# Altium integrated library CbyP.IntLib: 1144 symbols (part 6 of 6)
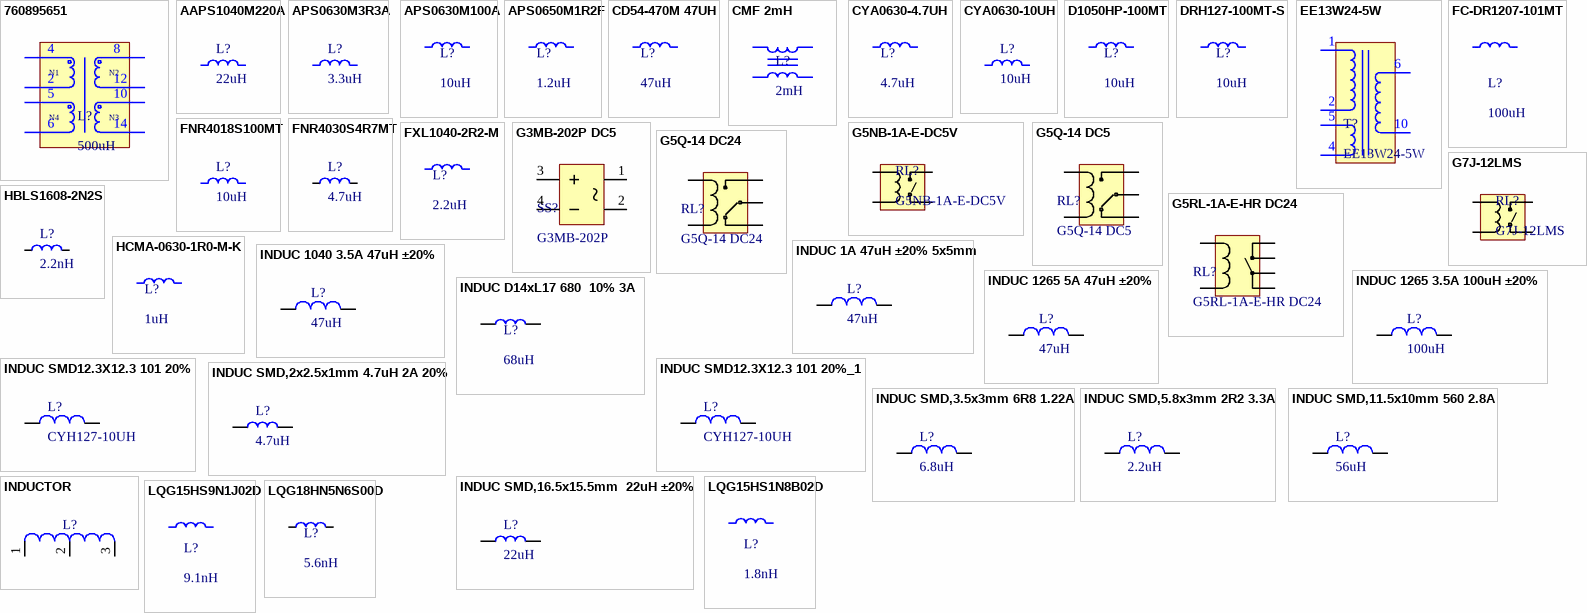
[diagram p46: symbols 760895651 to LQG18HN5N6S00D]

## INDUC SMD,11.5x10mm 560 2.8A
designator L?, comment 56uH
2.8A 56uH Integrated molded inductor ±20% 3.2A SMD,11.5x10mm Power Inductors ROHS; Manufacturer: cjiang (Changjiang Microelectronics Tech); Mfr.Part #: FXL1040-560-M; Name: INDUC SMD,11.5x10mm 560 2.8A; So_Chan_Dan: 2; So_Chan_Cam: 0; Package: SMD,11.5x10mm
footprint SMD,11.5x10mm-(1040)
footprint SMD,10.2x11mm-(1040)
pins: 1, 2

## INDUC SMD,16.5x15.5mm  22uH ±20%
designator L?, comment 22uH
22 µH Shielded Inductor 16 A 15.8mOhm Max Nonstandard; Manufacturer: Bourns Inc.; Mfr.Part #: SRP1510CA-220M; So_Chan_Dan: 2; So_Chan_Cam: 0; Name: INDUC SMD,16.5x15.5mm  22uH ±20%; Package: SMD,16.5x15.5mm
footprint SMD16.5x15.5mm
pins: 1, 2

## INDUCTOR
designator L?
footprint 8X10
pins: 1, 2, 3

## LQG15HS1N8B02D
designator L?, comment 1.8nH
FIXED IND 1.8nH 950mA 80mΩ 0402; Manufacturer: muRata; Mfr.Part #: LQG15HS1N8B02D; Package: 0402; LCSC Part #: C521065
footprint INDUC-0402-1
pins: 1, 2

## LQG15HS9N1J02D
designator L?, comment 9.1nH
FIXED IND 9.1nH 500mA 260mΩ 0402; Manufacturer: muRata; Mfr.Part #: LQG15HS9N1J02D; Package: 0402; LCSC Part #: C162547
footprint INDUC-0402
pins: 1, 2

## LQG18HN5N6S00D
designator L?, comment 5.6nH
800mA 5.6nH 200mΩ 0603 Inductors (SMD) ROHS; Manufacturer: Murata Electronics; Mfr.Part #: LQG18HN5N6S00D; Package: C441735; LCSC Part #: C41410710
footprint INDUC-0603
pins: 1, 2

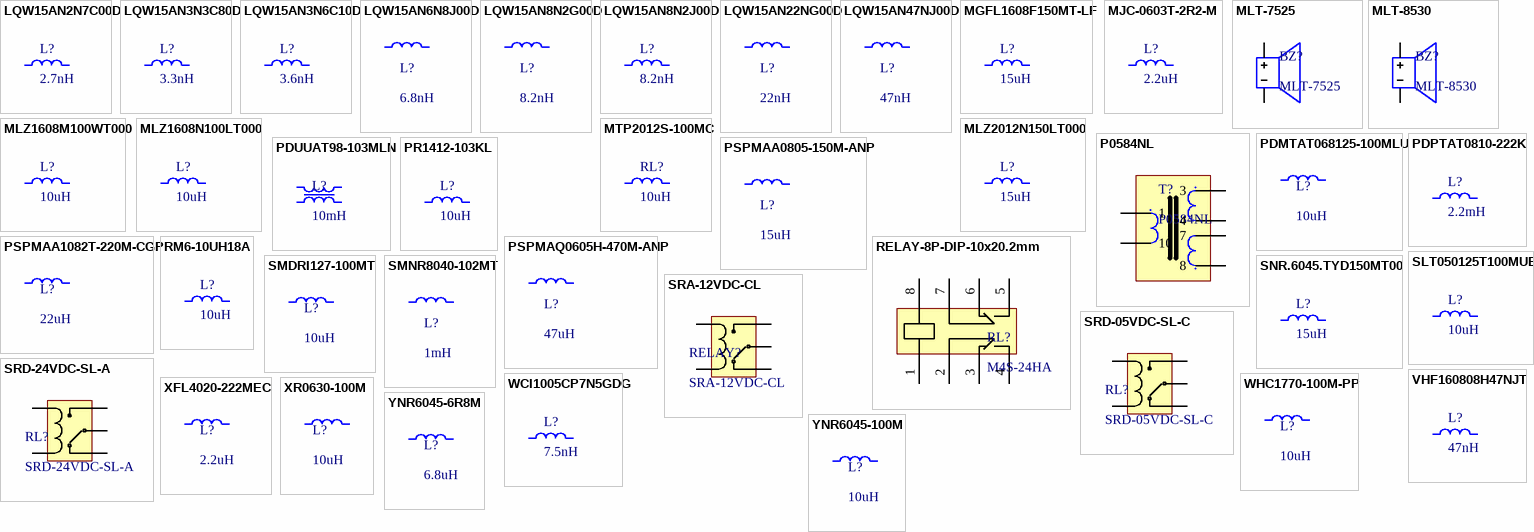
[diagram p36: symbols LQW15AN2N7C00D to YNR6045-100M]

## LQW15AN2N7C00D
designator L?, comment 2.7nH
FIXED IND 2.7nH 850mA 50mΩ 0402; Manufacturer: muRata; Mfr.Part #: LQW15AN2N7C00D; Package: 0402; LCSC Part #: C98058
footprint INDUC-0402
pins: 1, 2

## LQW15AN3N3C80D
designator L?, comment 3.3nH
FIXED IND 3.3nH 2A 30mΩ 0402; Manufacturer: muRata; Mfr.Part #: LQW15AN3N3C80D; Package: 0402; LCSC Part #: C237574
footprint INDUC-0402
pins: 1, 2

## LQW15AN3N6C10D
designator L?, comment 3.6nH
FIXED IND 3.6nH 900mA 40mΩ 0402; Manufacturer: muRata; Mfr.Part #: LQW15AN3N6C10D; Package: 0402; LCSC Part #: C408158
footprint INDUC-0402
pins: 1, 2

## LQW15AN6N8J00D
designator L?, comment 6.8nH
FIXED IND 6.8nH 700mA 90mΩ 0402; Manufacturer: muRata; Mfr.Part #: LQW15AN6N8J00D; Package: 0402; LCSC Part #: C113119
footprint INDUC-0402
pins: 1, 2

## LQW15AN8N2G00D
designator L?, comment 8.2nH
FIXED IND 8.2nH 540mA 140mΩ 0402; Manufacturer: muRata; Mfr.Part #: LQW15AN8N2G00D; Package: 0402; LCSC Part #: C84404
footprint INDUC-0402
pins: 1, 2

## LQW15AN8N2J00D
designator L?, comment 8.2nH
FIXED IND 8.2nH 540mA 140mΩ 0402; Manufacturer: muRata; Mfr.Part #: LQW15AN8N2J00D; Package: 0402; LCSC Part #: C98066
footprint INDUC-0402
pins: 1, 2

## LQW15AN22NG00D
designator L?, comment 22nH
FIXED IND 22nH 310mA 300mΩ 0402; Manufacturer: muRata; Mfr.Part #: LQW15AN22NG00D; Package: 0402; LCSC Part #: C86129
footprint INDUC-0402
pins: 1, 2

## LQW15AN47NJ00D
designator L?, comment 47nH
FIXED IND 47nH 210mA 1.08Ω 0402; Manufacturer: muRata; Mfr.Part #: LQW15AN47NJ00D; Package: 0402; LCSC Part #: C192855
footprint INDUC-0402
pins: 1, 2

## MGFL1608F150MT-LF
designator L?, comment 15uH
FIXED IND 15uH 220mA 900mΩ 0603; Manufacturer: microgate; Mfr.Part #: MGFL1608F150MT-LF; LCSC Part #: C486329; Package: 0603
footprint CAP-0603
pins: 1, 2

## MJC-0603T-2R2-M
designator L?, comment 2.2uH
9.5A 2.2uH ±20% 10A 15mΩ SMD,7.1x6.6mm Fixed Inductors RoHS; Manufacturer: Me-TECH; Mfr.Part #: MJC-0603T-2R2-M; Package: SMD,7.1x6.6mm; LCSC Part #: C501707; DigiKey Part Number: NO
footprint 0650 (SMD,7.1x6.6mm)
pins: 1, 2

## MLT-7525
designator BZ?
80dB Passive (external drive) Electromagnetic Type 2.7kHz SMD,7.5x7.5mm Buzzers ROHS; Manufacturer: Jiangsu Huaneng Elec; Mfr.Part #: MLT-7525; Name: MLT-7525; Package: SMD,7.5x7.5mm
footprint SMD,7.5x7.5mm
pins: 1 +, 2 -

## MLT-8530
designator BZ?
80dB Passive (external drive) Electromagnetic Type 2.7kHz SMD,8.5x8.5mm Buzzers ROHS; Manufacturer: Jiangsu Huaneng Elec; Mfr.Part #: MLT-8530; Name: MLT-8530; Package: SMD,8.5x8.5mm
footprint SMD,8.5x8.5mm
pins: 1 +, 2 -

## MLZ1608M100WT000
designator L?, comment 10uH
250mA 10uH 90mA 1.05Ω Multilayer inductor ±20% 0603 Fixed Inductors RoHS; Manufacturer: TDK; Mfr.Part #: MLZ1608M100WT000; LCSC Part #: C76798; Package: 0603; DigiKey Part Number: 445-6389-2-ND; ComponentLink1Description: Link; ComponentLink1URL: https://www.lcsc.com/product-detail/C76798.html; ComponentLink2Description: Link 1; ComponentLink2URL: https://www.digikey.com/en/products/detail/tdk/MLZ1608M100WT000/2465148?s=N4IgTCBcDaILIBkBaBGAbABgBxxRjA6gCr4YgC6AvkA
footprint CAP-0603
pins: 1, 2

## MLZ1608N100LT000
designator L?, comment 10uH
FIXED IND 10uH 600mΩ 0603; Manufacturer: TDK; Mfr.Part #: MLZ1608N100LT000; LCSC Part #: C194437; Package: 0603
footprint CAP-0603
pins: 1, 2

## MLZ2012N150LT000
designator L?, comment 15uH
FIXED IND 15uH 350mA 470mΩ 0805; Manufacturer: TDK; Mfr.Part #: MLZ2012N150LT000; Package: 0805; LCSC Part #: C531290
footprint INDUC-0805
pins: 1, 2

## MTP2012S-100MC
designator RL?, comment 10uH
10uH SMD,21.5x22.5mm, 6.5mΩ; Manufacturer: NO; Mfr.Part #: MTP2012S-100MC; DigiKey Part Number: NO; LCSC Part #: NO; Package: SMD,21.5x22.5mm; ComponentLink1Description: Link; ComponentLink1URL: https://detail.tmall.com/item.htm?abbucket=13&id=830337168403&mi_id=0000HfZtw201IDY-IbBo5SBGln4Rs-xlnrA7bLsp8-ByO4c&ns=1&priceTId=2100cff517743435818743772e0cc2&skuId=5563931960637&spm=a21n57.1.hoverItem.11&utparam=%7B%22aplus_abtest%22%3A%2250db852e2facc06d265983063d788b35%22%7D&xxc=taobaoSearch; ComponentLink2Description: Link 1
footprint Plugin,15.6x19.2mm
pins: 1, 2

## P0584NL
designator T?
1:1:1 Plugin,20.6x12.2mm Pulse Transformers(LAN) ROHS; Manufacturer: Pulse Elec; So_Chan_Dan: 6; So_Chan_Cam: 0; Mfr.Part #: P0584NL; Name: P0584NL; Package: Plugin,20.6x12.2mm
footprint Plugin,20.6x12.2mm
pins: 1, 3, 4, 7, 8, 10

## PDMTAT068125-100MLU
designator L?, comment 10uH
FIXED IND 10uH 18A 5mΩ Through Hole,23x12mm; Manufacturer: PROD Tech; Mfr.Part #: PDMTAT068125-100MLU; Package: Through Hole,23x12mm; LCSC Part #: C3011538; DigiKey Part Number: NO; ComponentLink1Description: Link; ComponentLink1URL: https://www.lcsc.com/product-detail/C3011538.html?s_z=n_q_c3011538; ComponentLink2Description: Link 1
footprint Through Hole,23x12mm
pins: 1, 2

## PDPTAT0810-222K
designator L?, comment 2.2mH
FIXED IND 2.2mH 150mA 3Ω Through Hole,D9.5xL12mm; Manufacturer: PROD Tech; Mfr.Part #: PDPTAT0810-222K; Package: Through Hole,D9.5xL12mm; LCSC Part #: C2924240
footprint Through Hole,D9.5xL12mm
pins: 1, 2

## PDUUAT98-103MLN
designator L?, comment 10mH
10mH@1kHz 700mΩ 2 Through Hole-4P,17x12mm Common Mode Chokes RoHS; Manufacturer: PROD Tech; Mfr.Part #: PDUUAT98-103MLN; Package: Through Hole-4P,17x12mm; LCSC Part #: C2909797; DigiKey Part Number: NO; ComponentLink1Description: Link; ComponentLink1URL: https://www.lcsc.com/product-detail/C2909797.html?s_z=n_PDUUAT98-103MLN; ComponentLink2Description: Link 1
footprint Through Hole-4P,17x12mm
pins: 1, 2, 3, 4

## PR1412-103KL
designator L?, comment 10uH
10uH SMD, 14.8.5x14.8mm, 4.5mΩ, Isat 13.2A; Manufacturer: NO; Mfr.Part #: PR1412-103KL; DigiKey Part Number: NO; LCSC Part #: NO; Package: Through Hole,19x13mm; ComponentLink1Description: Link; ComponentLink1URL: https://item.taobao.com/item.htm?abbucket=13&id=725913032063&mi_id=0000W4tRZelso7aPibs8_fbthC11EoOECsZTn6bmB6H3vFQ&ns=1&priceTId=2100c91417744267005415896e0cec&skuId=5042227721595&spm=a21n57.1.hoverItem.4&utparam=%7B%22aplus_abtest%22%3A%223d869fd202b0042b0842ae423ef7ce38%22%7D&xxc=taobaoSearch; ComponentLink2Description: Link 1
footprint PR1412
pins: 1, 2

## PSPMAA0805-150M-ANP
designator L?, comment 15uH
FIXED IND 15uH 5A 50mΩ SMD,8x8.5mm; Manufacturer: PROD Tech; Mfr.Part #: PSPMAA0805-150M-ANP; Package: SMD,8.5x8mm; LCSC Part #: C2962886
footprint SMD,8.5x8mm-0850
pins: 1, 2

## PSPMAA1082T-220M-CGP
designator L?, comment 22uH
8A 22uH 35mΩ 10A Molded Inductor ±20% SMD,11x10mm Fixed Inductors RoHS; Manufacturer: PROD Tech; Mfr.Part #: PSPMAA1082T-220M-CGP; Package: SMD,11x10mm; LCSC Part #: C47149121; DigiKey Part Number: NO; ComponentLink1Description: Link; ComponentLink1URL: https://www.lcsc.com/product-detail/C47149121.html?s_z=n_C47149121; ComponentLink2Description: Link 1
footprint SMD,11x10mm
pins: 1, 2

## PSPMAQ0605H-470M-ANP
designator L?, comment 47uH
FIXED IND 47uH 2A 180mΩ SMD,6.6x7.1mm; Manufacturer: PROD Tech; Mfr.Part #: PSPMAQ0605H-470M-ANP; Package: SMD,7.1x6.6mm; LCSC Part #: C436585
footprint 0650 (SMD,7.1x6.6mm)
pins: 1, 2

## RELAY-8P-DIP-10x20.2mm
designator RL?, comment M4S-24HA
2A 24V 30V@DC DPDT (2 Form C) 2A@125VAC DIP,10x20.2mm Signal Relays ROHS
footprint DIP,10x20.2mm
pins: 1, 2 1, 3, 4, 5, 6, 7, 8

## RM6-10UH18A
designator L?, comment 10uH
10uH SMD, 21.5x22.5mm, 5mΩ, Isat 12A; Manufacturer: NO; Mfr.Part #: MTP2012S-100MC; DigiKey Part Number: NO; LCSC Part #: NO; Package: Through Hole,19x13mm; ComponentLink1Description: Link; ComponentLink1URL: https://detail.tmall.com/item.htm?abbucket=13&id=830337168403&mi_id=0000HfZtw201IDY-IbBo5SBGln4Rs-xlnrA7bLsp8-ByO4c&ns=1&priceTId=2100cff517743435818743772e0cc2&skuId=5563931960630&spm=a21n57.1.hoverItem.11&utparam=%7B%22aplus_abtest%22%3A%2250db852e2facc06d265983063d788b35%22%7D&xxc=taobaoSearch; ComponentLink2Description: Link 1
footprint RM6
pins: 1, 2

## SLT050125T100MUB
designator L?, comment 10uH
5A 10uH ±20% 10mΩ Toroidal inductor Through Hole Fixed Inductors RoHS; Manufacturer: Sunltech; Mfr.Part #: SLT050125T100MUB; Package: Through Hole; LCSC Part #: C326008; DigiKey Part Number: NO; ComponentLink1Description: Link; ComponentLink1URL: https://www.lcsc.com/product-detail/C326008.html?s_z=n_q_C326008; ComponentLink2Description: Link 1
footprint Through Hole,16.5x8.5MM
pins: 1, 2

## SMDRI127-100MT
designator L?, comment 10uH
10uH 9A 21mΩ Magnetic Shielded Inductor ±20% SMD,12.3x12.3mm Fixed Inductors RoHS; Manufacturer: Shun Xiang Nuo; Mfr.Part #: SMDRI127-100MT; Package: SMD,12.5x12.5mm; LCSC Part #: C9904; DigiKey Part Number: NO; ComponentLink1Description: Link; ComponentLink1URL: https://www.lcsc.com/product-detail/C9904.html
footprint SMD,12.5x12.5x8mm
pins: 1, 2

## SMNR8040-102MT
designator L?, comment 1mH
FIXED IND 1mH 400mA 3.64Ω SMD,8x8mm; Manufacturer: Shun Xiang Nuo; Mfr.Part #: SMNR8040-102MT; Package: SMD,8x8mm; LCSC Part #: C467163
footprint SMD,8x8mm
pins: 1, 2

## SNR.6045.TYD150MT00
designator L?, comment 15uH
1.9A 15uH ±20% 2.5A SMD,6x6mm Power Inductors ROHS; Manufacturer: SOREDE; Mfr.Part #: SNR.6045.TYD150MT00; Package: SMD,6x6mm; LCSC Part #: C5122846; DigiKey Part Number: NO; ComponentLink1Description: Link; ComponentLink1URL: https://www.lcsc.com/product-detail/C5122846.html?s_z=n_SNR.6045.TYD150MT00; ComponentLink2Description: Link 1
footprint SMD,6x6x4.5mm
pins: 1, 2

## SRA-12VDC-CL
designator RELAY?
125V@AC 12V 10A One Conversion: 1C (SPDT-Conversion) Plugin,12.4x16mm Power Relays ROHS; Manufacturer: Ningbo Songle Relay; So_Chan_Cam: 5; Name: SRA-12VDC-CL; Mfr.Part #: SRA-12VDC-CL
footprint Plugin,12.4x16mm
pins: 1, 2, 3, 4, 5

## SRD-05VDC-SL-C
designator RL?
250V@AC 5V 15A One Conversion: 1C (SPDT-Conversion) Plugin,15.6x19.2mm Power Relays ROHS; Manufacturer: Ningbo Songle Relay; So_Chan_Cam: 5; So_Chan_Dan: 0; Name: SRD-05VDC-SL-C; Mfr.Part #: SRD-05VDC-SL-C; Package: Plugin,15.6x19.2mm
footprint Plugin,15.6x19.2mm
pins: 1, 2, 3, 4, 5

## SRD-24VDC-SL-A
designator RL?
Power Relay 1 Form A: 1A (SPST-NO) 24V Coil Through Hole,15.6x19.2mm; Manufacturer: Songle Relay; DigiKey Part Number: NO; Mfr.Part #: SRD-24VDC-SL-A; LCSC Part #: C140616; Package: Through Hole,19.2x15.6mm; ComponentLink1Description: Link; ComponentLink1URL: https://www.lcsc.com/product-detail/C140616.html?s_z=n_SRD-24VDC-SL-A; ComponentLink2Description: Link 1
footprint Plugin,15.6x19.2mm
pins: 1, 2, 3, 4, 5

## VHF160808H47NJT
designator L?, comment 47nH
200mA 47nH 1Ω ±5% 0603 Fixed Inductors RoHS; Manufacturer: FH; Mfr.Part #: VHF160808H47NJT; Package: 0402; LCSC Part #: C90210; DigiKey Part Number: NO; ComponentLink1Description: Link; ComponentLink1URL: https://www.lcsc.com/product-detail/C90210.html?s_z=n_47nh&spm=wm.ssy.bg.9.xh&lcsc_vid=QwdcUVxUFAdbVwUFRQBWBVECTlNYX1QAQFddU1EFQ1kxVlNRQ1NfVVVRR1dXUTsOAxUeFF5JWBYZEEoKFBINSQcJGk4dAgUUFAk%3D; ComponentLink2Description: Link 1
footprint INDUC_0603
pins: 1, 2

## WCI1005CP7N5GDG
designator L?, comment 7.5nH
FIXED IND 7.5NH 680MA 100 MOHM; Manufacturer: INPAQ Technology Co., Ltd; Mfr.Part #: WCI1005CP7N5GDG; Package: 0402; DigiKey Part Number: 3526-WCI1005CP7N5GDGTR-ND
footprint INDUC-0402
pins: 1, 2

## WHC1770-100M-PP
designator L?, comment 10uH
10uH 9.89mΩ Molded Power Inductor ±20% SMD,17.5x17mm Fixed Inductors RoHS; Manufacturer: NO; Mfr.Part #: WHC1770-100M-PP; Package: SMD,17.5x17mm; LCSC Part #: NO; DigiKey Part Number: NO; ComponentLink1Description: Link; ComponentLink2Description: Link 1; ComponentLink2URL: *
footprint SMD,17.5x17mm
pins: 1, 2

## XFL4020-222MEC
designator L?, comment 2.2uH
8A 2.2uH 21.35mΩ 3.7A ±20% SMD,4x4mm Fixed Inductors RoHS; Manufacturer: Coilcraft; Mfr.Part #: XFL4020-222MEC; Package: SMD,4x4mm; LCSC Part #: C122469; DigiKey Part Number: 2457-XFL4020-222MEC-ND; ComponentLink1Description: Link; ComponentLink1URL: https://www.lcsc.com/product-detail/C122469.html; ComponentLink2Description: Link 1; ComponentLink2URL: https://www.digikey.com/en/products/detail/coilcraft/XFL4020-222MEC/21381254?s=N4IgTCBcDaIBoDEAyAWADGNBaMuCyAogMIgC6AvkA
footprint SMD,4x4x2mm
pins: 1, 2

## XR0630-100M
designator L?, comment 10uH
4.5A 10uH ±20% 5.5A 68mΩ Molded Inductor SMD,7x6.6mm Fixed Inductors RoHS; Manufacturer: XR; Mfr.Part #: XR0630-100M; Package: SMD,7x6.6mm; LCSC Part #: C5307622
footprint 0630,SMD,7x6.6x3mm
pins: 1, 2

## YNR6045-6R8M
designator L?, comment 6.8uH
3A 6.8uH 31mΩ Magnetic Shielded Inductor ±20% SMD,6x6mm Fixed Inductors RoHS; Manufacturer: YJYCOIN; Mfr.Part #: YNR6045-6R8M; Package: SMD,6x6mm; LCSC Part #: C341066; DigiKey Part Number: NO; ComponentLink1Description: Link; ComponentLink1URL: https://www.lcsc.com/product-detail/C341066.html
footprint SMD,6x6x4.5mm
pins: 1, 2

## YNR6045-100M
designator L?, comment 10uH
2.45A 10uH 48mΩ Magnetic Shielded Inductor ±20% SMD,6x6mm Fixed Inductors RoHS; Manufacturer: YJYCOIN; Mfr.Part #: YNR6045-100M; Package: SMD,6x6mm; LCSC Part #: C341067; DigiKey Part Number: NO; ComponentLink1Description: Link; ComponentLink1URL: https://www.lcsc.com/product-detail/C341067.html?s_z=n_YNR6045-100
footprint SMD,6x6x4.5mm
pins: 1, 2

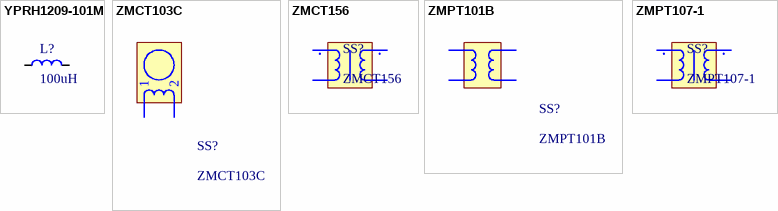
[diagram p37: symbols YPRH1209-101M to ZMPT107-1]

## YPRH1209-101M
designator L?, comment 100uH
2.31A 100uH Shielded Power Inductor ±20% SMD,12x12mm Power Inductors ROHS; Manufacturer: YJYCOIN; Mfr.Part #: YPRH1209-101M; Package: SMD,12x12mm
footprint SMD,12X12MM-INDUCTOR
pins: 1, 2

## ZMCT103C
designator SS?
5mA 1000:1 5A Through Hole Current Transformers RoHS; Manufacturer: ZHE MING LANG XI; Mfr.Part #: ZMCT103C; Package: Through Hole; LCSC Part #: C94571; DigiKey Part Number: NO
footprint ZMCT103C
pins: 1, 2

## ZMCT156
designator SS?
Current Transformer 2.5mA 5A Through Hole Current Sense Transformers RoHS; Manufacturer: ZHE MING LANG XI; Mfr.Part #: ZMCT156; Package: Through Hole; LCSC Part #: C5240952
footprint ZMCT156
pins: 1, 2, 3, 4

## ZMPT101B
designator SS?
2mA 1:1 2mA Through Hole Current Transformers RoHS; Manufacturer: ZHE MING LANG XI; Mfr.Part #: ZMPT101B; Package: Through Hole; LCSC Part #: C111858; DigiKey Part Number: NO
footprint ZMPT101B
pins: 1, 2, 3, 4

## ZMPT107-1
designator SS?
VOLT SENSE XFMR 1:1 2mA TH; Manufacturer: ZHE MING LANG XI; Mfr.Part #: ZMPT107-1; Package: Through Hole; LCSC Part #: C125191
footprint ZMPT107-1
pins: 1, 2, 3, 4


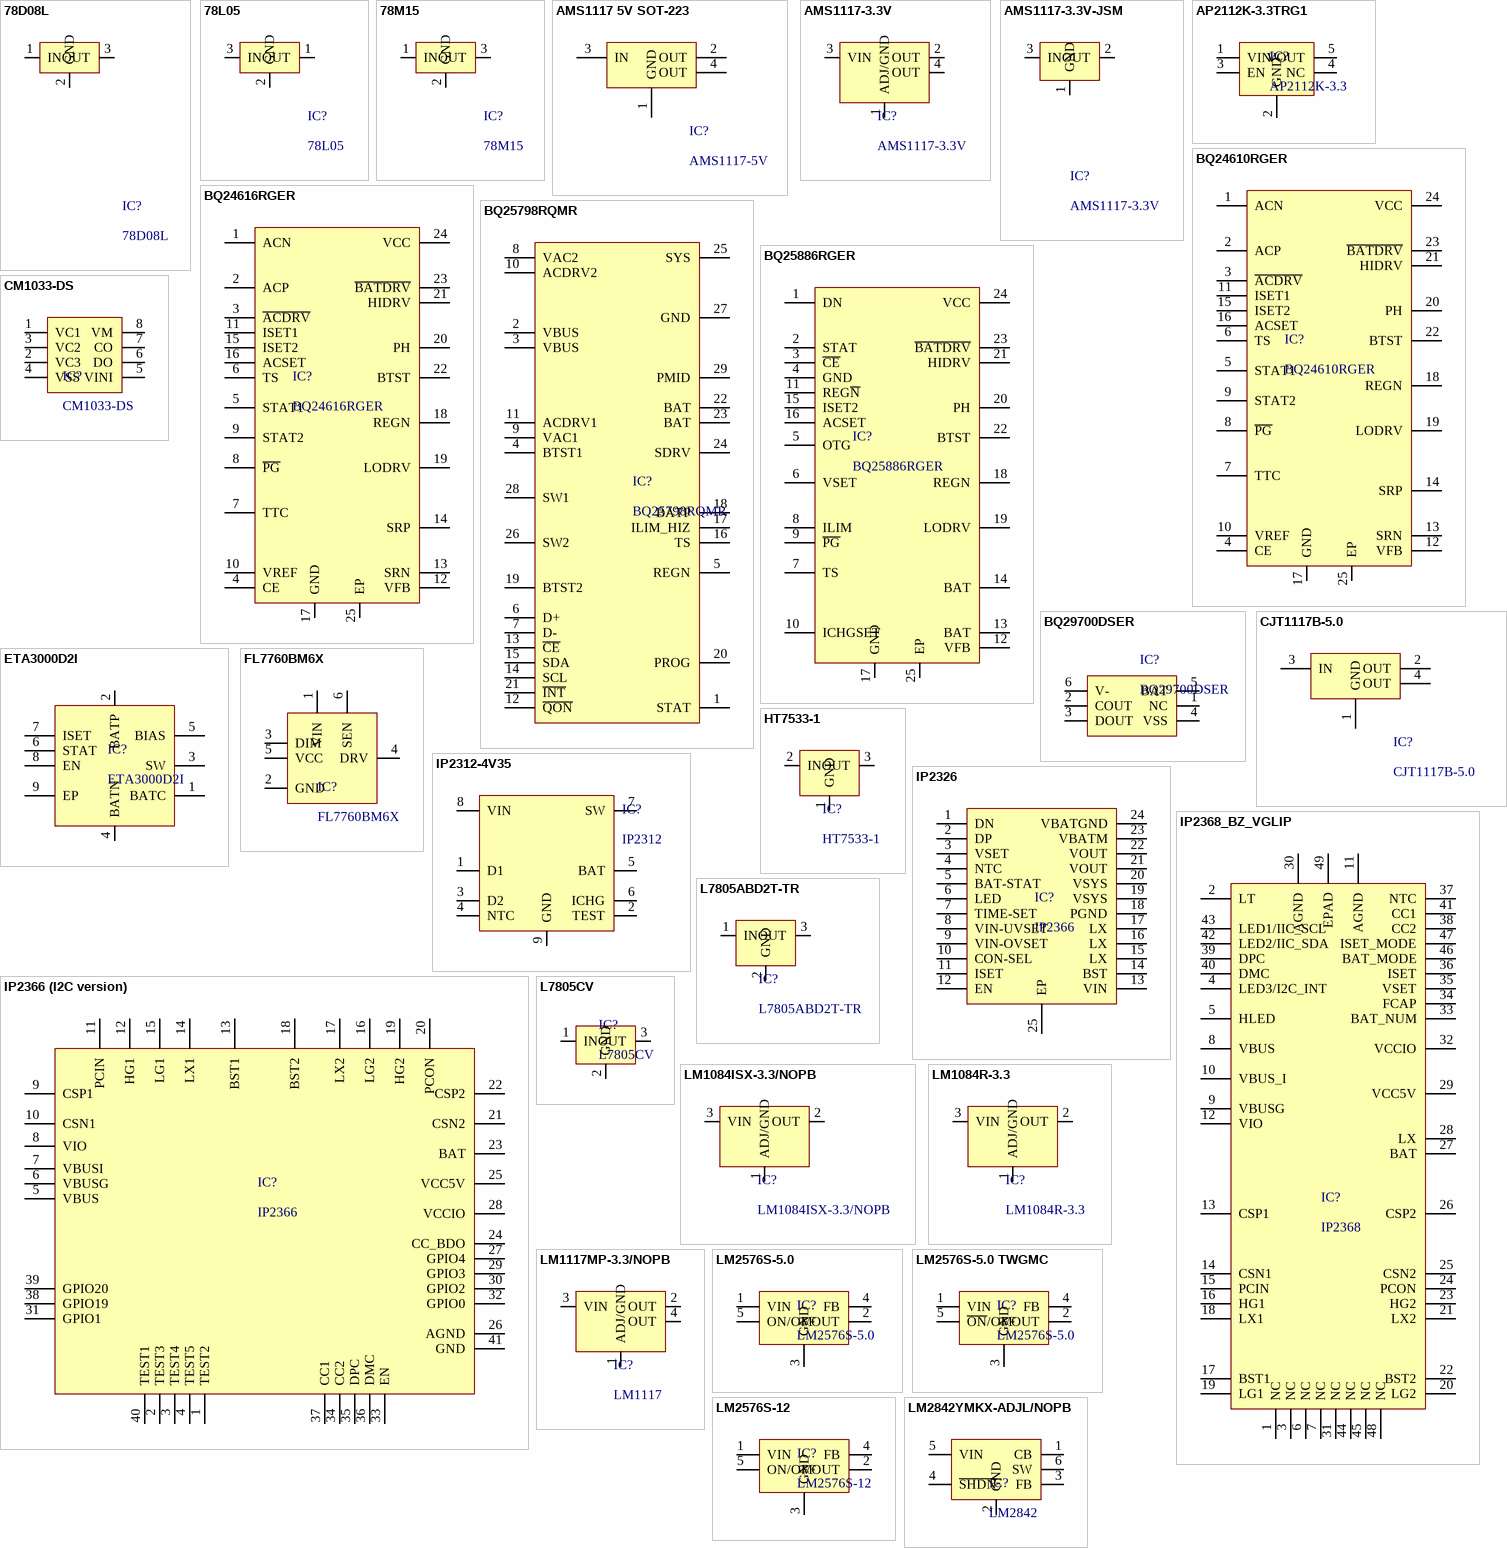
[diagram p38: symbols 78D08L to LM2842YMKX-ADJL/NOPB]

## 78D08L
designator IC?
80dB@(120Hz) 1A Fixed 8V Positive 23V TO-252-2 Voltage Regulators - Linear, Low Drop Out (LDO) Regulators ROHS; Manufacturer: UMW; Mfr.Part #: 78D08L; Package: TO-252-2; LCSC Part #: C347286
footprint TO-252
pins: 1 IN, 2 GND, 3 OUT

## 78L05
designator IC?
100mA Fixed 5V Positive electrode 30V SOT-89 Voltage Regulators - Linear, Low Drop Out (LDO) Regulators ROHS; Manufacturer: MSKSEMI; Mfr.Part #: MS78L05; So_Chan_Dan: 3; So_Chan_Cam: 0; Name: 78L05; ComponentLink1Description: New link; ComponentLink1URL: https://www.lcsc.com/datasheet/lcsc_datasheet_2311231510_MSKSEMI-AMS1117-5-0V_C7473143.pdf; Package: SOT-89
footprint SOT-89
pins: 1 OUT, 2 GND, 3 IN

## 78M15
designator IC?
70dB@(120Hz) 1A Fixed 15V 35V TO-252 Voltage Regulators - Linear, Low Drop Out (LDO) Regulators ROHS; Manufacturer: UMW(Youtai Semiconductor Co., Ltd.); Mfr.Part #: 78M15; Package: TO-252
footprint TO-252
pins: 1 IN, 2 GND, 3 OUT

## AMS1117 5V SOT-223
designator IC?, comment AMS1117-5V
1A Fixed 5V Positive electrode 15V SOT-223 Voltage Regulators - Linear, Low Drop Out (LDO) Regulators ROHS; Manufacturer: MSKSEMI; Mfr.Part #: AMS1117-5.0(MS); So_Chan_Dan: 4; So_Chan_Cam: 0; Name: AMS1117-5.0(MS); ComponentLink1Description: New link; ComponentLink1URL: https://www.lcsc.com/product-detail/Voltage-Regulators-Linear-Low-Drop-Out-LDO-Regulators_MSKSEMI-AMS1117-5-0-MS_C20538892.html; Package: SOT-223
footprint SOT-223
pins: 1 GND, 2 OUT, 3 IN, 4 OUT

## AMS1117-3.3V
designator IC?
Linear Voltage Regulator IC Positive Fixed 1 Output 1A SOT-223; Manufacturer: MSKSEMI; Mfr.Part #: AMS1117-3.3V; Package: SOT-223; LCSC Part #: C5120765; DigiKey Part Number: NO; ComponentLink1Description: Link; ComponentLink1URL: https://www.lcsc.com/product-detail/C5120765.html?s_z=n_C5120765
footprint SOT-223
pins: 1 ADJ/GND, 2 OUT, 3 VIN, 4 OUT

## AMS1117-3.3V-JSM
designator IC?, comment AMS1117-3.3V
3.3V 15V Positive Fixed SOT-89 Voltage Regulators - Linear, Low Drop Out (LDO) Regulators RoHS; Manufacturer: JSMSEMI; Mfr.Part #: AMS1117-3.3V-JSM; LCSC Part #: C18190088; ComponentLink1Description: Link; ComponentLink1URL: https://www.lcsc.com/product-detail/C18190088.html?s_z=n_C18190088; Package: SOT-89; DigiKey Part Number: NO; ComponentLink2Description: Link 1; ComponentLink2URL: *
footprint SOT-89
pins: 1 GND, 2 OUT, 3 IN

## AP2112K-3.3TRG1
designator IC?, comment AP2112K-3.3
65dB@(1kHz) 600mA Fixed 3.3V Positive 6V SOT-25-5 Voltage Regulators - Linear, Low Drop Out (LDO) Regulators ROHS; Manufacturer: Diodes Incorporated; Mfr.Part #: AP2112K-3.3TRG1; Package: SOT-25-5; LCSC Part #: C51118
footprint SOT25-5
pins: 1 VIN, 2 GND, 3 EN, 4 NC, 5 VOUT

## BQ24610RGER
designator IC?
Stand-Alone Synchronous Switch-Mode Li-lon or Li-Polymer Battery Charger with System Power Selector and LowI; Manufacturer: Texas Instruments; Package: VQFN-24(4x4); LCSC Part #: C19384; Mfr.Part #: BQ24610RGER
footprint VQFN-24-EP(4x4)
pins: 1 ACN, 2 ACP, 3 ~{ACDRV}, 4 CE, 5 STAT1, 6 TS, 7 TTC, 8 ~{PG}, 9 STAT2, 10 VREF, 11 ISET1, 12 VFB, 13 SRN, 14 SRP, 15 ISET2, 16 ACSET, 17 GND, 18 REGN, 19 LODRV, 20 PH, 21 HIDRV, 22 BTST, 23 ~{BATDRV}, 24 VCC, 25 EP

## BQ24616RGER
designator IC?
Stand-Alone Synchronous Switch-Mode Li-lon or Li-Polymer Battery Charger with System Power Selector and LowI; Manufacturer: TI; Package: VQFN-24-EP(4x4); LCSC Part #: C473390; Mfr.Part #: BQ24616RGER
footprint VQFN-24-EP(4x4)
pins: 1 ACN, 2 ACP, 3 ~{ACDRV}, 4 CE, 5 STAT1, 6 TS, 7 TTC, 8 ~{PG}, 9 STAT2, 10 VREF, 11 ISET1, 12 VFB, 13 SRN, 14 SRP, 15 ISET2, 16 ACSET, 17 GND, 18 REGN, 19 LODRV, 20 PH, 21 HIDRV, 22 BTST, 23 ~{BATDRV}, 24 VCC, 25 EP

## BQ25798RQMR
designator IC?
Battery Charging IC Lithium Battery QFN-29(4x4); Manufacturer: TI; Package: QFN-29(4x4); LCSC Part #: C2876593; Mfr.Part #: BQ25798RQMR; DigiKey Part Number: 296-BQ25798RQMRTR-ND; ComponentLink1Description: Link; ComponentLink1URL: https://www.lcsc.com/product-detail/C2876593.html?s_z=n_BQ25798RQMR; ComponentLink2Description: Link 1; ComponentLink2URL: https://www.digikey.com/en/products/detail/texas-instruments/BQ25798RQMR/15666783?s=N4IgTCBcDaIEIEUwFYDsBOAHAJQQWRAF0BfIA
footprint 29-VQFN-HR (4x4)
pins: 1 STAT, 2 VBUS, 3 VBUS, 4 BTST1, 5 REGN, 6 D+, 7 D-, 8 VAC2, 9 VAC1, 10 ACDRV2, 11 ACDRV1, 12 ~{QON}, 13 ~{CE}, 14 SCL, 15 SDA, 16 TS, 17 ILIM_HIZ, 18 BATP, 19 BTST2, 20 PROG, 21 ~{INT}, 22 BAT, 23 BAT, 24 SDRV, 25 SYS, 26 SW2, 27 GND, 28 SW1, 29 PMID

## BQ25886RGER
designator IC?
Stand-alone 2-cell battery charger with boost mode featuring PowerPath, USB BC1.2 detection, and USB On-the-Go (OTG) boost; Manufacturer: TI; Package: VQFN-24-EP(4x4); LCSC Part #: C2765094; Mfr.Part #: BQ25886RGER
footprint VQFN-24-EP(4x4)
pins: 1 DN, 2 STAT, 3 ~{CE}, 4 GND, 5 OTG, 6 VSET, 7 TS, 8 ILIM, 9 ~{PG}, 10 ICHGSET, 11 REG~{N}, 12 VFB, 13 BAT, 14 BAT, 15 ISET2, 16 ACSET, 17 GND, 18 REGN, 19 LODRV, 20 PH, 21 HIDRV, 22 BTST, 23 ~{BATDRV}, 24 VCC, 25 EP

## BQ29700DSER
designator IC?
Cost-Effective Voltage and Current Protection Integrated Circuit for Single-Cell Li-lon and Li-Polymer Batteries; Manufacturer: TI; Mfr.Part #: BQ29700DSER; LCSC Part #: C183096; Package: WSON-6(1.5x1.5)
footprint WSON-6(1.5x1.5)
pins: 1 NC, 2 COUT, 3 DOUT, 4 VSS, 5 BAT, 6 V-

## CJT1117B-5.0
designator IC?
75dB@(1kHz) 1A Fixed 5V Positive electrode 12V SOT-223 Voltage Regulators - Linear, Low Drop Out (LDO) Regulators ROHS; Manufacturer: Jiangsu Changjing Electronics Technology Co., Ltd.; Name: AMS1117-5.0(MS); So_Chan_Dan: 4; So_Chan_Cam: 0; Mfr.Part #: CJT1117B-5.0; ComponentLink1Description: New link; ComponentLink1URL: https://www.lcsc.com/product-detail/Voltage-Regulators-Linear-Low-Drop-Out-LDO-Regulators_Jiangsu-Changjing-Electronics-Technology-Co-Ltd-CJT1117B-5-0_C89273.html?s_z=n_CJT1117B; Package: SOT-223
footprint SOT-223
pins: 1 GND, 2 OUT, 3 IN, 4 OUT

## CM1033-DS
designator IC?
SOP-8 Battery Management ICs ROHS; Manufacturer: iCM; Mfr.Part #: CM1033-DS; Package: SOT-23-5; JLCPCB Part #: C2685513
footprint SOIC-8
pins: 1 VC1, 2 VC3, 3 VC2, 4 VSS, 5 VINI, 6 DO, 7 CO, 8 VM

## ETA3000D2I
designator IC?
Inductive Cell Balancer IC with Balancing Current Up to 2A; Manufacturer: etasolution; Mfr.Part #: ETA3000D2I; LCSC Part #: C7465544; Package: DFN2x2-8
footprint DFN2x2-8
pins: 1 BATC, 2 BATP, 3 SW, 4 BATN, 5 BIAS, 6 STAT, 7 ISET, 8 EN, 9 EP

## FL7760BM6X
designator IC?
High-Side Sensing Constant Current Buck Controller for High Switching Frequency LED Driver; Manufacturer: onsemi; Mfr.Part #: FL7760BM6X; Package: SOT-23-6; LCSC Part #: C367388; DigiKey Part Number: FL7760BM6XOSTR-ND; ComponentLink1Description: Link; ComponentLink1URL: https://www.lcsc.com/product-detail/C367388.html?s_z=n_FL7760&spm=wm.ssy.bg.0.xh&lcsc_vid=QVhYA1deElkMBVEAQVVWVAECEVVXUAcCTgNYUQVSEVAxVlNRQ1hYVFBfTlhcXzsOAxUeFF5JWBYZEEoKFBINSQcJGk4eFQsCAgIaSgADAwAHC0slRlleUFNRQlhADxALGw%3D%3D; ComponentLink2Description: Link 1; ComponentLink2URL: https://www.digikey.com/en/products/detail/onsemi/FL7760BM6X/7804375?s=N4IgTCBcDaIGIBkDsSBsAGAQgWVQDRAF0BfIA
footprint SOT23-6
pins: 1 VIN, 2 GND, 3 DIM, 4 DRV, 5 VCC, 6 SEN